# Altium footprint library agh_racing_2018.PcbLib: 166 footprints (part 11 of 11)
Each footprint in its own frame and in the unit in brackets; x right, y up, seen from the top. Pads: shape width x height; smd on the part's side, far side on the other; paste and mask are expansions set on the pad; w line width, h text height; cw(c..) or ccw(c..) is an arc to the next point about the centre after c.
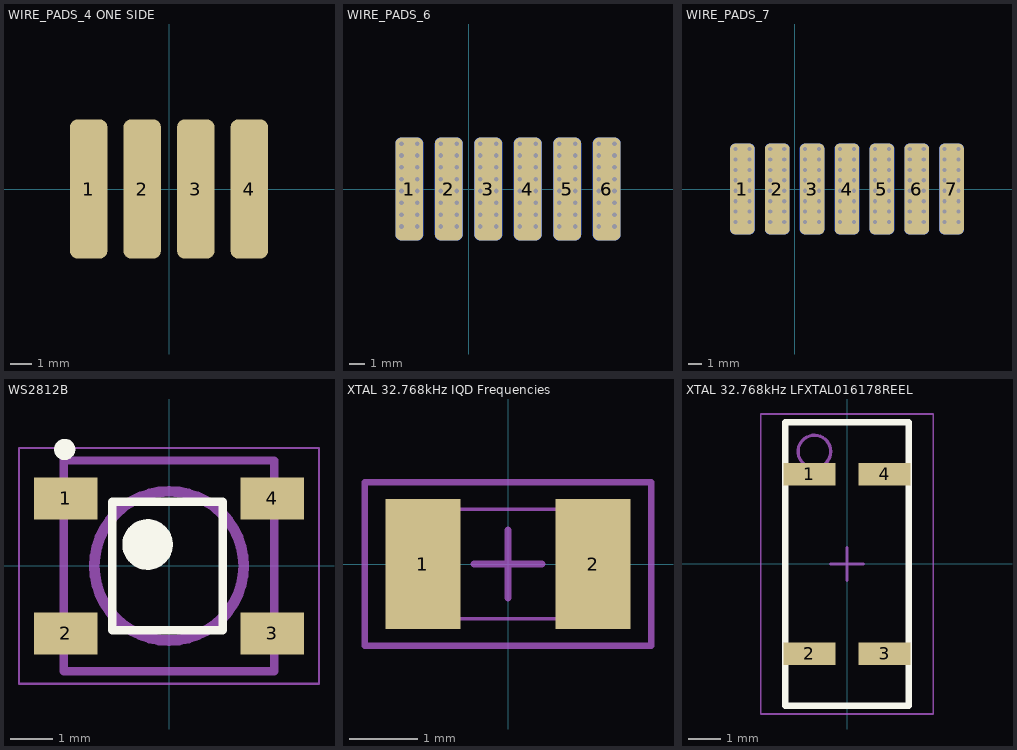
[diagram p10: the footprints below, top view; thin cyan lines are the x and y axes]

## WIRE_PADS_4 ONE SIDE [mil] "Wire Pads 2 Footprint"
pads (4):
  rrect40% 70x260 smd: 1(-150,0) 2(-50,0) 3(50,0) 4(150,0)

## WIRE_PADS_6 [mil] "Wire Pads 2 Footprint"
pads (12):
  rrect40% 70x260 smd: 1(-150,0) 2(-50,0) 3(50,0) 4(150,0) 5(250,0) 6(350,0)
  rrect40% 70x260 smd far side: 1(-150,0) 2(-50,0) 3(50,0) 4(150,0) 5(250,0) 6(350,0)
via 270,115 diameter 28 hole 11.81
via 270,85 diameter 28 hole 11.81
via 270,55 diameter 28 hole 11.81
via 270,25 diameter 28 hole 11.81
via 270,-5 diameter 28 hole 11.81
via 270,-35 diameter 28 hole 11.81
via 270,-65 diameter 28 hole 11.81
via 270,-95 diameter 28 hole 11.81
via 230,-95 diameter 28 hole 11.81
via 230,-65 diameter 28 hole 11.81
via 230,-35 diameter 28 hole 11.81
via 230,-5 diameter 28 hole 11.81
via 230,25 diameter 28 hole 11.81
via 230,55 diameter 28 hole 11.81
via 230,85 diameter 28 hole 11.81
via 230,115 diameter 28 hole 11.81
via 370,115 diameter 28 hole 11.81
via 370,85 diameter 28 hole 11.81
via 370,55 diameter 28 hole 11.81
via 370,25 diameter 28 hole 11.81
via 370,-5 diameter 28 hole 11.81
via 370,-35 diameter 28 hole 11.81
via 370,-65 diameter 28 hole 11.81
via 370,-95 diameter 28 hole 11.81
via 330,-95 diameter 28 hole 11.81
via 330,-65 diameter 28 hole 11.81
via 330,-35 diameter 28 hole 11.81
via 330,-5 diameter 28 hole 11.81
via 330,25 diameter 28 hole 11.81
via 330,55 diameter 28 hole 11.81
via 330,85 diameter 28 hole 11.81
via 330,115 diameter 28 hole 11.81
via 130,115 diameter 28 hole 11.81
via 130,85 diameter 28 hole 11.81
via 130,55 diameter 28 hole 11.81
via 130,25 diameter 28 hole 11.81
via 130,-5 diameter 28 hole 11.81
via 130,-35 diameter 28 hole 11.81
via 130,-65 diameter 28 hole 11.81
via 130,-95 diameter 28 hole 11.81
via 170,-95 diameter 28 hole 11.81
via 170,-65 diameter 28 hole 11.81
via 170,-35 diameter 28 hole 11.81
via 170,-5 diameter 28 hole 11.81
via 170,25 diameter 28 hole 11.81
via 170,55 diameter 28 hole 11.81
via 170,85 diameter 28 hole 11.81
via 170,115 diameter 28 hole 11.81
via 30,115 diameter 28 hole 11.81
via 30,85 diameter 28 hole 11.81
via 30,55 diameter 28 hole 11.81
via 30,25 diameter 28 hole 11.81
via 30,-5 diameter 28 hole 11.81
via 30,-35 diameter 28 hole 11.81
via 30,-65 diameter 28 hole 11.81
via 30,-95 diameter 28 hole 11.81
via 70,-95 diameter 28 hole 11.81
via 70,-65 diameter 28 hole 11.81
via 70,-35 diameter 28 hole 11.81
via 70,-5 diameter 28 hole 11.81
via 70,25 diameter 28 hole 11.81
via 70,55 diameter 28 hole 11.81
via 70,85 diameter 28 hole 11.81
via 70,115 diameter 28 hole 11.81
via -70,115 diameter 28 hole 11.81
via -70,85 diameter 28 hole 11.81
via -70,55 diameter 28 hole 11.81
via -70,25 diameter 28 hole 11.81
via -70,-5 diameter 28 hole 11.81
via -70,-35 diameter 28 hole 11.81
via -70,-65 diameter 28 hole 11.81
via -70,-95 diameter 28 hole 11.81
via -30,-95 diameter 28 hole 11.81
via -30,-65 diameter 28 hole 11.81
via -30,-35 diameter 28 hole 11.81
via -30,-5 diameter 28 hole 11.81
via -30,25 diameter 28 hole 11.81
via -30,55 diameter 28 hole 11.81
via -30,85 diameter 28 hole 11.81
via -30,115 diameter 28 hole 11.81
via -130,115 diameter 28 hole 11.81
via -130,85 diameter 28 hole 11.81
via -130,55 diameter 28 hole 11.81
via -130,25 diameter 28 hole 11.81
via -130,-5 diameter 28 hole 11.81
via -130,-35 diameter 28 hole 11.81
via -130,-65 diameter 28 hole 11.81
via -130,-95 diameter 28 hole 11.81
via -170,-95 diameter 28 hole 11.81
via -170,-65 diameter 28 hole 11.81
via -170,-35 diameter 28 hole 11.81
via -170,-5 diameter 28 hole 11.81
via -170,25 diameter 28 hole 11.81
via -170,55 diameter 28 hole 11.81
via -170,85 diameter 28 hole 11.81
via -170,115 diameter 28 hole 11.81

## WIRE_PADS_7 [mil] "Wire Pads 2 Footprint"
pads (14):
  rrect40% 70x260 smd: 1(-150,0) 2(-50,0) 3(50,0) 4(150,0) 5(250,0) 6(350,0) 7(450,0)
  rrect40% 70x260 smd far side: 1(-150,0) 2(-50,0) 3(50,0) 4(150,0) 5(250,0) 6(350,0) 7(450,0)
via 430,115 diameter 28 hole 11.81
via 430,85 diameter 28 hole 11.81
via 430,55 diameter 28 hole 11.81
via 430,25 diameter 28 hole 11.81
via 430,-5 diameter 28 hole 11.81
via 430,-35 diameter 28 hole 11.81
via 430,-65 diameter 28 hole 11.81
via 430,-95 diameter 28 hole 11.81
via 470,-95 diameter 28 hole 11.81
via 470,-65 diameter 28 hole 11.81
via 470,-35 diameter 28 hole 11.81
via 470,-5 diameter 28 hole 11.81
via 470,25 diameter 28 hole 11.81
via 470,55 diameter 28 hole 11.81
via 470,85 diameter 28 hole 11.81
via 470,115 diameter 28 hole 11.81
via 270,115 diameter 28 hole 11.81
via 270,85 diameter 28 hole 11.81
via 270,55 diameter 28 hole 11.81
via 270,25 diameter 28 hole 11.81
via 270,-5 diameter 28 hole 11.81
via 270,-35 diameter 28 hole 11.81
via 270,-65 diameter 28 hole 11.81
via 270,-95 diameter 28 hole 11.81
via 230,-95 diameter 28 hole 11.81
via 230,-65 diameter 28 hole 11.81
via 230,-35 diameter 28 hole 11.81
via 230,-5 diameter 28 hole 11.81
via 230,25 diameter 28 hole 11.81
via 230,55 diameter 28 hole 11.81
via 230,85 diameter 28 hole 11.81
via 230,115 diameter 28 hole 11.81
via 370,115 diameter 28 hole 11.81
via 370,85 diameter 28 hole 11.81
via 370,55 diameter 28 hole 11.81
via 370,25 diameter 28 hole 11.81
via 370,-5 diameter 28 hole 11.81
via 370,-35 diameter 28 hole 11.81
via 370,-65 diameter 28 hole 11.81
via 370,-95 diameter 28 hole 11.81
via 330,-95 diameter 28 hole 11.81
via 330,-65 diameter 28 hole 11.81
via 330,-35 diameter 28 hole 11.81
via 330,-5 diameter 28 hole 11.81
via 330,25 diameter 28 hole 11.81
via 330,55 diameter 28 hole 11.81
via 330,85 diameter 28 hole 11.81
via 330,115 diameter 28 hole 11.81
via 130,115 diameter 28 hole 11.81
via 130,85 diameter 28 hole 11.81
via 130,55 diameter 28 hole 11.81
via 130,25 diameter 28 hole 11.81
via 130,-5 diameter 28 hole 11.81
via 130,-35 diameter 28 hole 11.81
via 130,-65 diameter 28 hole 11.81
via 130,-95 diameter 28 hole 11.81
via 170,-95 diameter 28 hole 11.81
via 170,-65 diameter 28 hole 11.81
via 170,-35 diameter 28 hole 11.81
via 170,-5 diameter 28 hole 11.81
via 170,25 diameter 28 hole 11.81
via 170,55 diameter 28 hole 11.81
via 170,85 diameter 28 hole 11.81
via 170,115 diameter 28 hole 11.81
via 30,115 diameter 28 hole 11.81
via 30,85 diameter 28 hole 11.81
via 30,55 diameter 28 hole 11.81
via 30,25 diameter 28 hole 11.81
via 30,-5 diameter 28 hole 11.81
via 30,-35 diameter 28 hole 11.81
via 30,-65 diameter 28 hole 11.81
via 30,-95 diameter 28 hole 11.81
via 70,-95 diameter 28 hole 11.81
via 70,-65 diameter 28 hole 11.81
via 70,-35 diameter 28 hole 11.81
via 70,-5 diameter 28 hole 11.81
via 70,25 diameter 28 hole 11.81
via 70,55 diameter 28 hole 11.81
via 70,85 diameter 28 hole 11.81
via 70,115 diameter 28 hole 11.81
via -70,115 diameter 28 hole 11.81
via -70,85 diameter 28 hole 11.81
via -70,55 diameter 28 hole 11.81
via -70,25 diameter 28 hole 11.81
via -70,-5 diameter 28 hole 11.81
via -70,-35 diameter 28 hole 11.81
via -70,-65 diameter 28 hole 11.81
via -70,-95 diameter 28 hole 11.81
via -30,-95 diameter 28 hole 11.81
via -30,-65 diameter 28 hole 11.81
via -30,-35 diameter 28 hole 11.81
via -30,-5 diameter 28 hole 11.81
via -30,25 diameter 28 hole 11.81
via -30,55 diameter 28 hole 11.81
via -30,85 diameter 28 hole 11.81
via -30,115 diameter 28 hole 11.81
via -130,115 diameter 28 hole 11.81
via -130,85 diameter 28 hole 11.81
via -130,55 diameter 28 hole 11.81
via -130,25 diameter 28 hole 11.81
via -130,-5 diameter 28 hole 11.81
via -130,-35 diameter 28 hole 11.81
via -130,-65 diameter 28 hole 11.81
via -130,-95 diameter 28 hole 11.81
via -170,-95 diameter 28 hole 11.81
via -170,-65 diameter 28 hole 11.81
via -170,-35 diameter 28 hole 11.81
via -170,-5 diameter 28 hole 11.81
via -170,25 diameter 28 hole 11.81
via -170,55 diameter 28 hole 11.81
via -170,85 diameter 28 hole 11.81
via -170,115 diameter 28 hole 11.81

## WS2812B [mm]
pads (4):
  rect 1.5x1 smd: 1(-2.45,1.6) 2(-2.45,-1.6) 3(2.45,-1.6) 4(2.45,1.6)
Top Overlay:
  circle w0.25: c-2.471,2.761 r0.125
  circle w0.6: c-0.508,0.508 r0.3
  lines w0.2: -1.346,-1.524 1.27,-1.524 1.27,1.524 -1.346,1.524 -1.346,-1.524
Mechanical 1:
  circle w0.254: c0,0 r1.769
  lines w0.2: -2.5,-2.5 2.5,-2.5 2.5,2.5 -2.5,2.5 -2.5,-2.5
Mechanical 15:
  lines w0.05: -3.556,-2.794 3.556,-2.794 3.556,2.794 -3.556,2.794 -3.556,-2.794
3D body "WS2812_RGB_LED_updated.stp": height 1.7, standoff 0, extent -2.675,-2.475 2.675,2.475

## XTAL 32.768kHz IQD Frequencies [mm] "2-Leads, Body 1,5x3,20mm"
height 0.9
pads (2):
  rect 1.1x1.9 smd: 1(-1.25,0) 2(1.25,0)
Mechanical 13:
  lines w0.1: -2.1,-1.2 2.1,-1.2 2.1,1.2 -2.1,1.2 -2.1,-1.2
Mechanical 15:
  lines w0.05: -1.7,-0.8 1.7,-0.8 1.7,0.8 -1.7,0.8 -1.7,-0.8
  lines w0.1: -0.5,0 0.5,0 ; 0,-0.5 0,0.5
3D body "User Library-ABS07.STEP": height 0.91, standoff 0, extent -1.61,-0.8 1.61,0.72

## XTAL 32.768kHz LFXTAL016178REEL [mm] "4-Leads, Body 8,70x3,80mm"
height 2.6
pads (4):
  rect 1.6x0.7 smd: 1(-1.15,2.75) 2(-1.15,-2.75) 3(1.15,-2.75) 4(1.15,2.75)
Top Overlay:
  circle w0.25: c-1.3,2.8 r0.125
  lines w0.2: -1.9,-4.35 1.9,-4.35 1.9,4.35 -1.9,4.35 -1.9,-4.35
Mechanical 13:
  circle w0.1: c-1,3.45 r0.5
  lines w0.1: -1.9,-4.35 1.9,-4.35 1.9,4.35 -1.9,4.35 -1.9,-4.35
Mechanical 15:
  lines w0.05: -2.65,-4.6 2.65,-4.6 2.65,4.6 -2.65,4.6 -2.65,-4.6
  lines w0.1: -0.5,0 0.5,0 ; 0,-0.5 0,0.5
3D body "ABRACON_ABS25-32.768KHZ-6-T.STEP": height 2.66, standoff 0, extent -2,-4 2,4